# Altium footprint library 6-Connectors-5.PcbLib: 46 footprints (part 2 of 5) (continued)
## 3M_N3627-6202RB [mm] "3M, 3000 Series, 24 Contacts - Pitch 2.54mm - Straight Four-Wall Header (Black) With Short Roll Pin Latch/Ejectors" (continued)

## 3M_N3764-6002RB [mm] "3M, 3000 Series, 64 Contacts - Pitch 2.54mm - Straight Four-Wall Header (Black) Without Latch/Ejectors"
height 17.3
pads (66):
  round 1.6 hole 0.9: 1(-39.37,-1.27) 2(-39.37,1.27) 3(-36.83,-1.27) 4(-36.83,1.27) 5(-34.29,-1.27) 6(-34.29,1.27) 7(-31.75,-1.27) 8(-31.75,1.27) 9(-29.21,-1.27) 10(-29.21,1.27) 11(-26.67,-1.27) 12(-26.67,1.27) 13(-24.13,-1.27) 14(-24.13,1.27) 15(-21.59,-1.27) 16(-21.59,1.27) 17(-19.05,-1.27) 18(-19.05,1.27) 19(-16.51,-1.27) 20(-16.51,1.27) 21(-13.97,-1.27) 22(-13.97,1.27) 23(-11.43,-1.27) 24(-11.43,1.27) 25(-8.89,-1.27) 26(-8.89,1.27) 27(-6.35,-1.27) 28(-6.35,1.27) 29(-3.81,-1.27) 30(-3.81,1.27) 31(-1.27,-1.27) 32(-1.27,1.27) 33(1.27,-1.27) 34(1.27,1.27) 35(3.81,-1.27) 36(3.81,1.27) 37(6.35,-1.27) 38(6.35,1.27) 39(8.89,-1.27) 40(8.89,1.27) 41(11.43,-1.27) 42(11.43,1.27) 43(13.97,-1.27) 44(13.97,1.27) 45(16.51,-1.27) 46(16.51,1.27) 47(19.05,-1.27) 48(19.05,1.27) 49(21.59,-1.27) 50(21.59,1.27) 51(24.13,-1.27) 52(24.13,1.27) 53(26.67,-1.27) 54(26.67,1.27) 55(29.21,-1.27) 56(29.21,1.27) 57(31.75,-1.27) 58(31.75,1.27) 59(34.29,-1.27) 60(34.29,1.27) 61(36.83,-1.27) 62(36.83,1.27) 63(39.37,-1.27) 64(39.37,1.27)
  round 4.6 hole 2.6: MTG1(-48.31,-0.254) MTG2(48.31,-0.254)
Top Overlay:
  lines w0.2: -50.292,-2 -50.292,-4.318 50.292,-4.318 50.292,-2 ; -50.292,1.7 -50.292,4.3 50.292,4.3 50.292,1.7 ; -43.307,-3.175 43.307,-3.175 43.307,3.175 -43.307,3.175 -43.307,-3.175 ; -40.64,-3.175 -39.37,-4.318 -38.1,-3.175 -40.64,-3.175
  text "64" at 40.605,1.727 h1.02
  text "1" at -41.707,-2.921 h1.02
Mechanical 8:
  drawing of 276 lines, arcs and shapes, not listed
Mechanical 14:
  circle w0.1: c-48.324,-0.254 r1.27
  circle w0.1: c48.324,-0.254 r1.27
  lines w0.1: -50.292,-3.175 -46.964,-3.175 ; -49.324,-0.254 -48.324,-0.254 ; -48.324,-1.254 -48.324,-0.254 ; -48.324,0.746 -48.324,-0.254 ; -47.324,-0.254 -48.324,-0.254 ; -46.964,-4.318 -46.964,-1.727 ; -46.964,1.27 -46.964,4.318 ; -46.122,-4.318 -46.122,-1.727 ; -46.122,1.27 -46.122,4.318 ; -43.689,-4.318 -43.688,-1.727 ; -43.307,-1.727 -43.307,-3.175 ; -43.307,1.27 -43.307,3.175 ; -36.519,-4.318 -36.519,-3.175 ; -34.601,-4.318 -34.601,-3.175 ; -3.302,-4.318 -3.302,-3.175 ; 0.762,-4.318 0.762,-3.175 ; 37.141,-4.318 37.141,-3.175 ; 39.059,-4.318 39.059,-3.175 ; 42.846,-4.318 42.846,-3.175 ; 42.846,3.175 42.846,4.318 ; 43.307,-1.727 43.307,-3.175 ; 43.307,1.27 43.307,3.175 ; 43.688,1.27 43.688,4.318 ; 43.729,-4.318 43.729,-1.727 ; 46.122,-4.318 46.122,-1.727 ; 46.122,1.27 46.122,4.318 ; 46.964,-4.318 46.964,-1.727 40.005,-1.727 40.005,1.27 46.964,1.27 46.964,4.318 ; 46.964,-3.175 50.292,-3.175 ; 46.964,3.175 50.292,3.175 ; 47.324,-0.254 48.324,-0.254 ; 48.324,-1.254 48.324,-0.254 ; 48.324,0.746 48.324,-0.254 ; 49.324,-0.254 48.324,-0.254 ; -50.292,-4.318 -50.292,4.318 ; -50.292,-4.318 -50.292,4.318 ; -50.292,-4.318 -50.292,4.318 ; -50.292,-4.318 50.292,-4.318 ; -50.292,4.318 50.292,4.318 ; -43.307,-3.175 -43.307,3.175 ; -43.307,-3.175 -43.307,3.175 ; -43.307,-3.175 43.307,-3.175 ; -43.307,3.175 43.307,3.175 ; 43.307,-3.175 43.307,3.175 ; 43.307,-3.175 43.307,3.175 ; 50.292,-4.318 50.292,4.318 ; 50.292,-4.318 50.292,4.318 ; -50.292,3.175 -46.964,3.175 -50.292,3.175 ; -49.848,-1.134 -49.848,0.626 -48.324,1.506 -46.8,0.626 -46.8,-1.134 -48.324,-2.014 -49.848,-1.134 ; -43.688,1.27 -43.688,4.318 -43.688,1.27 ; -42.846,-4.318 -42.846,-3.175 -42.846,-4.318 ; -42.846,3.175 -42.846,4.318 -42.846,3.175 ; 46.8,-1.134 46.8,0.626 48.324,1.506 49.848,0.626 49.848,-1.134 48.324,-2.014 46.8,-1.134
  text "64" at 40.605,1.727 h1.02
  text "1" at -41.707,-2.921 h1.02
3D body "3M_N3764-6002RB.stp": height 17.27, standoff -3.94, extent -50.292,-4.318 50.292,4.318

## 3M_N3764-6202RB [mm] "3M, 3000 Series, 64 Contacts - Pitch 2.54mm - Straight Four-Wall Header (Black) With Short Roll Pin Latch/Ejectors"
height 24.6
pads (66):
  round 1.6 hole 0.9: 1(-39.37,-1.27) 2(-39.37,1.27) 3(-36.83,-1.27) 4(-36.83,1.27) 5(-34.29,-1.27) 6(-34.29,1.27) 7(-31.75,-1.27) 8(-31.75,1.27) 9(-29.21,-1.27) 10(-29.21,1.27) 11(-26.67,-1.27) 12(-26.67,1.27) 13(-24.13,-1.27) 14(-24.13,1.27) 15(-21.59,-1.27) 16(-21.59,1.27) 17(-19.05,-1.27) 18(-19.05,1.27) 19(-16.51,-1.27) 20(-16.51,1.27) 21(-13.97,-1.27) 22(-13.97,1.27) 23(-11.43,-1.27) 24(-11.43,1.27) 25(-8.89,-1.27) 26(-8.89,1.27) 27(-6.35,-1.27) 28(-6.35,1.27) 29(-3.81,-1.27) 30(-3.81,1.27) 31(-1.27,-1.27) 32(-1.27,1.27) 33(1.27,-1.27) 34(1.27,1.27) 35(3.81,-1.27) 36(3.81,1.27) 37(6.35,-1.27) 38(6.35,1.27) 39(8.89,-1.27) 40(8.89,1.27) 41(11.43,-1.27) 42(11.43,1.27) 43(13.97,-1.27) 44(13.97,1.27) 45(16.51,-1.27) 46(16.51,1.27) 47(19.05,-1.27) 48(19.05,1.27) 49(21.59,-1.27) 50(21.59,1.27) 51(24.13,-1.27) 52(24.13,1.27) 53(26.67,-1.27) 54(26.67,1.27) 55(29.21,-1.27) 56(29.21,1.27) 57(31.75,-1.27) 58(31.75,1.27) 59(34.29,-1.27) 60(34.29,1.27) 61(36.83,-1.27) 62(36.83,1.27) 63(39.37,-1.27) 64(39.37,1.27)
  round 4.6 hole 2.6: MTG1(-48.31,-0.254) MTG2(48.31,-0.254)
Top Overlay:
  lines w0.2: -50.292,-2 -50.292,-4.318 50.292,-4.318 50.292,-2 ; -50.292,1.7 -50.292,4.3 50.292,4.3 50.292,1.7 ; -43.307,-3.175 43.307,-3.175 43.307,3.175 -43.307,3.175 -43.307,-3.175 ; -40.64,-3.175 -39.37,-4.318 -38.1,-3.175 -40.64,-3.175
  text "64" at 40.605,1.727 h1.02
  text "1" at -41.707,-2.921 h1.02
Mechanical 8:
  drawing of 276 lines, arcs and shapes, not listed
Mechanical 14:
  circle w0.1: c-48.324,-0.254 r1.27
  circle w0.1: c48.324,-0.254 r1.27
  lines w0.1: -50.292,-3.175 -46.964,-3.175 ; -49.324,-0.254 -48.324,-0.254 ; -48.324,-1.254 -48.324,-0.254 ; -48.324,0.746 -48.324,-0.254 ; -47.324,-0.254 -48.324,-0.254 ; -46.964,-4.318 -46.964,-1.727 ; -46.964,1.27 -46.964,4.318 ; -46.122,-4.318 -46.122,-1.727 ; -46.122,1.27 -46.122,4.318 ; -43.689,-4.318 -43.688,-1.727 ; -43.307,-1.727 -43.307,-3.175 ; -43.307,1.27 -43.307,3.175 ; -36.519,-4.318 -36.519,-3.175 ; -34.601,-4.318 -34.601,-3.175 ; -3.302,-4.318 -3.302,-3.175 ; 0.762,-4.318 0.762,-3.175 ; 37.141,-4.318 37.141,-3.175 ; 39.059,-4.318 39.059,-3.175 ; 42.846,-4.318 42.846,-3.175 ; 42.846,3.175 42.846,4.318 ; 43.307,-1.727 43.307,-3.175 ; 43.307,1.27 43.307,3.175 ; 43.688,1.27 43.688,4.318 ; 43.729,-4.318 43.729,-1.727 ; 46.122,-4.318 46.122,-1.727 ; 46.122,1.27 46.122,4.318 ; 46.964,-4.318 46.964,-1.727 40.005,-1.727 40.005,1.27 46.964,1.27 46.964,4.318 ; 46.964,-3.175 50.292,-3.175 ; 46.964,3.175 50.292,3.175 ; 47.324,-0.254 48.324,-0.254 ; 48.324,-1.254 48.324,-0.254 ; 48.324,0.746 48.324,-0.254 ; 49.324,-0.254 48.324,-0.254 ; -50.292,-4.318 -50.292,4.318 ; -50.292,-4.318 -50.292,4.318 ; -50.292,-4.318 -50.292,4.318 ; -50.292,-4.318 50.292,-4.318 ; -50.292,4.318 50.292,4.318 ; -43.307,-3.175 -43.307,3.175 ; -43.307,-3.175 -43.307,3.175 ; -43.307,-3.175 43.307,-3.175 ; -43.307,3.175 43.307,3.175 ; 43.307,-3.175 43.307,3.175 ; 43.307,-3.175 43.307,3.175 ; 50.292,-4.318 50.292,4.318 ; 50.292,-4.318 50.292,4.318 ; -50.292,3.175 -46.964,3.175 -50.292,3.175 ; -49.848,-1.134 -49.848,0.626 -48.324,1.506 -46.8,0.626 -46.8,-1.134 -48.324,-2.014 -49.848,-1.134 ; -43.688,1.27 -43.688,4.318 -43.688,1.27 ; -42.846,-4.318 -42.846,-3.175 -42.846,-4.318 ; -42.846,3.175 -42.846,4.318 -42.846,3.175 ; 46.8,-1.134 46.8,0.626 48.324,1.506 49.848,0.626 49.848,-1.134 48.324,-2.014 46.8,-1.134
  text "64" at 40.605,1.727 h1.02
  text "1" at -41.707,-2.921 h1.02
3D body "3M_N3764-6202RB.stp": height 17.98, standoff -3.94, extent -59.689,-4.318 59.689,4.318

## 3M_N3793-6202RB [mm] "3M, 3000 Series, 10 Contacts - Pitch 2.54mm - Straight Four-Wall Header (Black) With Short Roll Pin Latch/Ejectors"
height 24.6
pads (12):
  round 1.6 hole 0.9: 1(-5.08,-1.27) 2(-5.08,1.27) 3(-2.54,-1.27) 4(-2.54,1.27) 5(0,-1.27) 6(0,1.27) 7(2.54,-1.27) 8(2.54,1.27) 9(5.08,-1.27) 10(5.08,1.27)
  round 4.6 hole 2.8: MTG1(-14.034,-0.256) MTG2(14.034,-0.252)
Top Overlay:
  lines w0.2: -15.998,-2.109 -15.998,-4.318 15.998,-4.318 15.998,-2.104 ; -15.998,1.596 -15.998,4.318 15.998,4.318 15.998,1.601 ; -6.35,-3.175 -5.08,-4.318 -3.81,-3.175 ; -2.03,-4.318 -2.03,-3.174 ; 2.032,-4.318 2.032,-3.174 ; 2.851,-4.318 2.851,-3.174 ; 4.767,-4.318 4.767,-3.174 ; -9.015,-3.174 9.015,-3.174 9.015,3.176 -9.015,3.176 -9.015,-3.174
  text "1" at -7.417,-2.921 h1.02
Mechanical 8:
  lines w0.1: -14.534,-0.256 -14.034,-0.256 ; -14.034,-0.756 -14.034,-0.256 ; -14.034,0.244 -14.034,-0.256 ; -13.534,-0.256 -14.034,-0.256 ; -5.58,-1.27 -5.08,-1.27 ; -5.58,1.27 -5.08,1.27 ; -5.08,-1.77 -5.08,-1.27 ; -5.08,-0.77 -5.08,-1.27 ; -5.08,0.77 -5.08,1.27 ; -5.08,1.77 -5.08,1.27 ; -4.58,-1.27 -5.08,-1.27 ; -4.58,1.27 -5.08,1.27 ; -3.04,-1.27 -2.54,-1.27 ; -3.04,1.27 -2.54,1.27 ; -2.54,-1.77 -2.54,-1.27 ; -2.54,-0.77 -2.54,-1.27 ; -2.54,0.77 -2.54,1.27 ; -2.54,1.77 -2.54,1.27 ; -2.04,-1.27 -2.54,-1.27 ; -2.04,1.27 -2.54,1.27 ; -0.5,-1.27 0,-1.27 ; -0.5,0 0,0 ; -0.5,1.27 0,1.27 ; 0,-1.77 0,-1.27 ; 0,-0.77 0,-1.27 ; 0,-0.5 0,0 ; 0,0.5 0,0 ; 0,0.77 0,1.27 ; 0,1.77 0,1.27 ; 0.5,-1.27 0,-1.27 ; 0.5,0 0,0 ; 0.5,1.27 0,1.27 ; 2.04,-1.27 2.54,-1.27 ; 2.04,1.27 2.54,1.27 ; 2.54,-1.77 2.54,-1.27 ; 2.54,-0.77 2.54,-1.27 ; 2.54,0.77 2.54,1.27 ; 2.54,1.77 2.54,1.27 ; 3.04,-1.27 2.54,-1.27 ; 3.04,1.27 2.54,1.27 ; 4.58,-1.27 5.08,-1.27 ; 4.58,1.27 5.08,1.27 ; 5.08,-1.77 5.08,-1.27 ; 5.08,-0.77 5.08,-1.27 ; 5.08,0.77 5.08,1.27 ; 5.08,1.77 5.08,1.27 ; 5.58,-1.27 5.08,-1.27 ; 5.58,1.27 5.08,1.27 ; 13.534,-0.252 14.034,-0.252 ; 14.034,-0.752 14.034,-0.252 ; 14.034,0.248 14.034,-0.252 ; 14.534,-0.252 14.034,-0.252
Mechanical 14:
  lines w0.1: -15.998,-4.318 15.998,-4.318 ; -15.998,-4.318 -15.998,4.318 ; -15.998,-4.318 15.998,-4.318 ; -15.998,-4.318 -15.998,4.318 ; -15.998,4.318 15.998,4.318 ; -15.998,4.318 15.998,4.318 ; -15.553,-1.133 -14.719,-1.615 -15.553,-1.133 ; -15.553,-1.133 -15.553,0.628 ; -15.553,-1.133 -15.553,0.628 ; -15.553,0.628 -14.719,1.109 -15.553,0.628 ; -14.719,-1.727 -11.985,-1.727 ; -14.719,-1.727 -14.719,1.271 ; -14.719,-1.727 -11.985,-1.727 ; -14.719,-1.727 -14.719,1.271 ; -14.719,1.271 -11.985,1.271 ; -14.719,1.271 -11.985,1.271 ; -14.031,-2.014 -13.535,-1.727 -14.031,-2.014 ; -14.031,-2.014 -14.526,-1.727 -14.031,-2.014 ; -14.031,1.507 -14.439,1.271 -14.031,1.507 ; -14.031,1.507 -13.622,1.271 -14.031,1.507 ; -11.985,-2.819 -8.759,-2.819 ; -11.985,-2.819 -11.985,-1.727 ; -11.985,-2.819 -8.759,-2.819 ; -11.985,-2.819 -11.985,-1.727 ; -11.985,1.271 -11.985,2.362 ; -11.985,1.271 -11.985,2.362 ; -11.985,2.362 -8.763,2.362 -11.985,2.362 ; -9.015,-3.174 -9.015,-2.819 -9.015,-3.174 ; -9.015,-3.174 9.015,-3.174 ; -9.015,-3.174 9.015,-3.174 ; -9.015,3.176 -9.015,2.362 -9.015,3.176 ; -9.015,3.176 9.015,3.176 ; -9.015,3.176 9.015,3.176 ; -8.759,-2.819 -8.759,-1.727 ; -8.759,-2.819 -8.759,-1.727 ; -8.759,-1.727 -5.713,-1.727 ; -8.759,-1.727 -5.713,-1.727 ; -8.759,1.271 -5.713,1.271 ; -8.759,1.271 -8.759,2.362 -8.759,1.271 ; -8.759,1.271 -5.713,1.271 ; -5.713,-1.727 -5.713,1.271 ; -5.713,-1.727 -5.713,1.271 ; 5.713,-1.727 8.759,-1.727 ; 5.713,-1.727 5.713,1.271 ; 5.713,-1.727 8.759,-1.727 ; 5.713,-1.727 5.713,1.271 ; 5.713,1.271 8.759,1.271 ; 5.713,1.271 8.759,1.271 ; 8.759,-2.819 11.985,-2.819 ; 8.759,-2.819 8.759,-1.727 ; 8.759,-2.819 11.985,-2.819 ; 8.759,-2.819 8.759,-1.727 ; 8.759,1.271 8.759,2.362 ; 8.759,1.271 8.759,2.362 ; 8.759,2.362 11.985,2.362 ; 8.759,2.362 11.985,2.362 ; 9.015,-3.174 9.015,-2.819 9.015,-3.174 ; 9.015,3.176 9.015,2.362 9.015,3.176 ; 11.985,-2.819 11.985,-1.727 ; 11.985,-2.819 11.985,-1.727 ; 11.985,-1.727 14.719,-1.727 ; 11.985,-1.727 14.719,-1.727 ; 11.985,1.271 14.719,1.271 ; 11.985,1.271 11.985,2.362 ; 11.985,1.271 14.719,1.271 ; 11.985,1.271 11.985,2.362 ; 14.031,-2.014 13.535,-1.727 14.031,-2.014 ; 14.031,-2.014 14.526,-1.727 14.031,-2.014 ; 14.031,1.507 14.439,1.271 14.031,1.507 ; 14.031,1.507 13.622,1.271 14.031,1.507 ; 14.719,-1.727 14.719,1.271 ; 14.719,-1.727 14.719,1.271 ; 15.553,-1.133 14.719,-1.615 15.553,-1.133 ; 15.553,-1.133 15.553,0.628 ; 15.553,-1.133 15.553,0.628 ; 15.553,0.628 14.719,1.109 15.553,0.628 ; 15.998,-4.318 15.998,4.318 ; 15.998,-4.318 15.998,4.318 ; -15.998,-3.174 -12.67,-3.174 -15.998,-3.174 ; -15.998,3.176 -12.67,3.176 -15.998,3.176 ; -12.67,-4.318 -12.67,-1.727 -12.67,-4.318 ; -12.67,1.271 -12.67,4.318 -12.67,1.271 ; -11.831,-4.318 -11.831,-2.819 -11.831,-4.318 ; -11.831,2.362 -11.831,4.318 -11.831,2.362 ; -9.395,-4.318 -9.395,-2.819 -9.395,-4.318 ; -9.395,2.362 -9.395,4.318 -9.395,2.362 ; -8.553,-4.318 -8.553,-3.174 -8.553,-4.318 ; -8.553,3.176 -8.553,4.318 -8.553,3.176 ; -2.03,-4.318 -2.03,-3.174 -2.03,-4.318 ; 2.032,-4.318 2.032,-3.174 2.032,-4.318 ; 2.851,-4.318 2.851,-3.174 2.851,-4.318 ; 4.767,-4.318 4.767,-3.174 4.767,-4.318 ; 8.553,-4.318 8.553,-3.174 8.553,-4.318 ; 8.553,3.176 8.553,4.318 8.553,3.176 ; 9.395,-4.318 9.395,-2.819 9.395,-4.318 ; 9.395,2.362 9.395,4.318 9.395,2.362 ; 11.831,-4.318 11.831,-2.819 11.831,-4.318 ; 11.831,2.362 11.831,4.318 11.831,2.362 ; 12.67,-4.318 12.67,-1.727 12.67,-4.318 ; 12.67,-3.174 15.998,-3.174 12.67,-3.174 ; 12.67,1.271 12.67,4.318 12.67,1.271 ; 12.67,3.176 15.998,3.176 12.67,3.176
3D body "3M_N3793-6202RB.stp": height 24.64, standoff -3.94, extent -16.002,-4.318 16.002,4.318

## 3M_N10220-5212PC [mm] "20 contacts, Mini D Ribbon (MDR), 102 Series, .050\" Boardmount Through-hole Right Angle Receptacle-Shielded"
height 9.4
pads (22):
  round 1.4 hole 0.8: 1(-5.715,-4.826) 2(-4.445,-2.921) 3(-3.175,-4.826) 4(-1.905,-2.921) 5(-0.635,-4.826) 6(0.635,-2.921) 7(1.905,-4.826) 8(3.175,-2.921) 9(4.445,-4.826) 10(5.715,-2.921) 11(-5.715,-1.016) 12(-4.445,0.889) 13(-3.175,-1.016) 14(-1.905,0.889) 15(-0.635,-1.016) 16(0.635,0.889) 17(1.905,-1.016) 18(3.175,0.889) 19(4.445,-1.016) 20(5.715,0.889)
  round 5.5 hole 2.8: 21(-13.716,-2.921) 22(13.716,-2.921)
Top Overlay:
  circle w0.3: c-5.715,-6.35 r0.15
  lines w0.2: -16.637,-4.578 -16.637,-5.715 -15.5,-5.715 ; -16.637,-1.5 -16.637,5.715 16.637,5.715 16.637,-1.5 ; -12,-5.715 12,-5.715 ; -10.414,5.715 -10.414,10.541 ; -10.414,9.271 -11.684,9.271 -11.684,9.906 -11.049,10.541 -10.414,10.541 ; -9.525,-5.715 -9.525,2.159 9.525,2.159 9.525,-5.715 ; -9.144,5.715 -9.144,10.541 -10.414,10.541 ; -8.212,5.715 -8.212,11.049 8.212,11.049 8.212,5.715 ; 9.144,5.715 9.144,10.541 10.414,10.541 ; 10.414,5.715 10.414,10.541 ; 10.414,9.271 11.684,9.271 11.684,9.906 11.049,10.541 10.414,10.541 ; 15.5,-5.715 16.637,-5.715 16.637,-4.578
  text "1" at -7.225,-5.31 h1.02
  text "2" at -6.605,-3.405 h1.02
  text "12" at -7.255,0.405 h1.02
  text "11" at -8.025,-1.5 h1.02
  text "19" at 5.705,-1.505 h1.02
  text "9" at 5.727,-5.293 h1.02
  text "10" at 6.8,-3.435 h1.02
  text "20" at 6.8,0.375 h1.02
Mechanical 8:
  lines w0.1: -14.216,-2.921 -13.716,-2.921 ; -13.716,-3.421 -13.716,-2.921 ; -13.716,-2.421 -13.716,-2.921 ; -13.216,-2.921 -13.716,-2.921 ; -6.215,-4.826 -5.715,-4.826 ; -6.215,-1.016 -5.715,-1.016 ; -5.715,-5.326 -5.715,-4.826 ; -5.715,-4.326 -5.715,-4.826 ; -5.215,-4.826 -5.715,-4.826 ; -5.215,-1.016 -5.715,-1.016 ; -4.945,-2.921 -4.445,-2.921 ; -4.945,0.889 -4.445,0.889 ; -4.445,-3.421 -4.445,-2.921 ; -4.445,-2.421 -4.445,-2.921 ; -4.445,0.389 -4.445,0.889 ; -4.445,1.389 -4.445,0.889 ; -3.945,-2.921 -4.445,-2.921 ; -3.945,0.889 -4.445,0.889 ; -3.675,-4.826 -3.175,-4.826 ; -3.675,-1.016 -3.175,-1.016 ; -3.175,-5.326 -3.175,-4.826 ; -3.175,-4.326 -3.175,-4.826 ; -2.675,-4.826 -3.175,-4.826 ; -2.675,-1.016 -3.175,-1.016 ; -2.405,-2.921 -1.905,-2.921 ; -2.405,0.889 -1.905,0.889 ; -1.905,-3.421 -1.905,-2.921 ; -1.905,-2.421 -1.905,-2.921 ; -1.905,0.389 -1.905,0.889 ; -1.905,1.389 -1.905,0.889 ; -1.405,-2.921 -1.905,-2.921 ; -1.405,0.889 -1.905,0.889 ; -1.135,-4.826 -0.635,-4.826 ; -1.135,-1.016 -0.635,-1.016 ; -0.635,-5.326 -0.635,-4.826 ; -0.635,-4.326 -0.635,-4.826 ; -0.5,0 0,0 ; -0.135,-4.826 -0.635,-4.826 ; -0.135,-1.016 -0.635,-1.016 ; 0.135,-2.921 0.635,-2.921 ; 0.135,0.889 0.635,0.889 ; 0.5,0 0,0 ; 0.635,-3.421 0.635,-2.921 ; 0.635,-2.421 0.635,-2.921 ; 0.635,0.389 0.635,0.889 ; 0.635,1.389 0.635,0.889 ; 1.135,-2.921 0.635,-2.921 ; 1.135,0.889 0.635,0.889 ; 1.405,-4.826 1.905,-4.826 ; 1.405,-1.016 1.905,-1.016 ; 1.905,-5.326 1.905,-4.826 ; 1.905,-4.326 1.905,-4.826 ; 2.405,-4.826 1.905,-4.826 ; 2.405,-1.016 1.905,-1.016 ; 2.675,-2.921 3.175,-2.921 ; 2.675,0.889 3.175,0.889 ; 3.175,-3.421 3.175,-2.921 ; 3.175,-2.421 3.175,-2.921 ; 3.175,0.389 3.175,0.889 ; 3.175,1.389 3.175,0.889 ; 3.675,-2.921 3.175,-2.921 ; 3.675,0.889 3.175,0.889 ; 3.945,-4.826 4.445,-4.826 ; 3.945,-1.016 4.445,-1.016 ; 4.445,-5.326 4.445,-4.826 ; 4.445,-4.326 4.445,-4.826 ; 4.945,-4.826 4.445,-4.826 ; 4.945,-1.016 4.445,-1.016 ; 5.215,-2.921 5.715,-2.921 ; 5.215,0.889 5.715,0.889 ; 5.715,-3.421 5.715,-2.921 ; 5.715,-2.421 5.715,-2.921 ; 5.715,0.389 5.715,0.889 ; 5.715,1.389 5.715,0.889 ; 6.215,-2.921 5.715,-2.921 ; 6.215,0.889 5.715,0.889 ; 13.216,-2.921 13.716,-2.921 ; 13.716,-3.421 13.716,-2.921 ; 13.716,-2.421 13.716,-2.921 ; 14.216,-2.921 13.716,-2.921 ; -5.715,-1.016 -5.715,-1.516 -5.715,-1.016 ; -5.715,-1.016 -5.715,-0.516 -5.715,-1.016 ; -3.175,-1.016 -3.175,-1.516 -3.175,-1.016 ; -3.175,-1.016 -3.175,-0.516 -3.175,-1.016 ; -0.635,-1.016 -0.635,-1.516 -0.635,-1.016 ; -0.635,-1.016 -0.635,-0.516 -0.635,-1.016 ; 0,0 0,-0.5 0,0 ; 0,0 0,0.5 0,0 ; 1.905,-1.016 1.905,-1.516 1.905,-1.016 ; 1.905,-1.016 1.905,-0.516 1.905,-1.016 ; 4.445,-1.016 4.445,-1.516 4.445,-1.016 ; 4.445,-1.016 4.445,-0.516 4.445,-1.016
Mechanical 14:
  circle w0.3: c-5.715,-6.35 r0.15
  circle w0.1: c13.716,-2.921 r1.245
  circle w0.1: c-13.716,-2.921 r1.245
  lines w0.1: -16.637,-5.715 -16.637,5.715 16.637,5.715 16.637,-5.715 ; -16.637,2.159 -10.795,2.159 -10.795,-5.715 ; -13.97,-4.139 -13.97,-5.099 -13.462,-5.099 -13.462,-4.139 ; -13.97,-1.703 -13.97,-0.743 -13.462,-0.743 -13.462,-1.703 ; -10.414,5.715 -10.414,10.541 ; -10.414,9.271 -11.684,9.271 -11.684,9.906 -11.049,10.541 -10.414,10.541 ; -9.525,-5.715 -9.525,2.159 9.525,2.159 9.525,-5.715 ; -9.144,5.715 -9.144,10.541 -10.414,10.541 ; -8.212,5.715 -8.212,11.049 8.212,11.049 8.212,5.715 ; 9.144,5.715 9.144,10.541 10.414,10.541 ; 10.414,5.715 10.414,10.541 ; 10.414,9.271 11.684,9.271 11.684,9.906 11.049,10.541 10.414,10.541 ; 10.795,-5.715 10.795,2.159 16.637,2.159 ; 13.462,-4.139 13.462,-5.099 13.97,-5.099 13.97,-4.139 ; 13.462,-1.703 13.462,-0.743 13.97,-0.743 13.97,-1.703
  text "1" at -7.225,-5.31 h1.02
  text "2" at -6.605,-3.405 h1.02
  text "12" at -7.255,0.405 h1.02
  text "11" at -8.025,-1.5 h1.02
  text "19" at 5.705,-1.505 h1.02
  text "9" at 5.727,-5.293 h1.02
  text "10" at 6.8,-3.435 h1.02
  text "20" at 6.8,0.375 h1.02
3D body "3M_N10220-5212PC.stp": height 9.4, standoff -3.81, extent -16.637,-5.715 16.637,11.049

## 3M_N10226-5212PC [mm] "26 contacts, Mini D Ribbon (MDR), 102 Series, .050\" Boardmount Through-hole Right Angle Receptacle-Shielded"
height 9.4
pads (28):
  round 1.4 hole 0.8: 1(-7.62,-4.826) 2(-6.35,-2.921) 3(-5.08,-4.826) 4(-3.81,-2.921) 5(-2.54,-4.826) 6(-1.27,-2.921) 7(0,-4.826) 8(1.27,-2.921) 9(2.54,-4.826) 10(3.81,-2.921) 11(5.08,-4.826) 12(6.35,-2.921) 13(7.62,-4.826) 14(-7.62,-1.016) 15(-6.35,0.889) 16(-5.08,-1.016) 17(-3.81,0.889) 18(-2.54,-1.016) 19(-1.27,0.889) 20(0,-1.016) 21(1.27,0.889) 22(2.54,-1.016) 23(3.81,0.889) 24(5.08,-1.016) 25(6.35,0.889) 26(7.62,-1.016)
  round 5.5 hole 2.8: 27(-15.621,-2.921) 28(15.621,-2.921)
Top Overlay:
  circle w0.3: c-7.62,-6.35 r0.15
  lines w0.2: -18.542,-4.578 -18.542,-5.715 -17.405,-5.715 ; -18.542,-1.5 -18.542,5.715 18.542,5.715 18.542,-1.5 ; -14,-5.715 14,-5.715 ; -12.319,5.715 -12.319,10.541 ; -12.319,9.271 -13.589,9.271 -13.589,9.906 -12.954,10.541 -12.319,10.541 ; -11.43,-5.715 -11.43,5.715 ; -11.43,2.159 11.43,2.159 ; -11.049,5.715 -11.049,10.541 -12.319,10.541 ; -10.1,5.715 -10.1,11.049 10.1,11.049 10.1,5.715 ; 11.049,5.715 11.049,10.541 12.319,10.541 ; 11.43,-5.715 11.43,5.715 ; 12.319,5.715 12.319,10.541 ; 12.319,9.271 13.589,9.271 13.589,9.906 12.954,10.541 12.319,10.541 ; 17.405,-5.715 18.542,-5.715 18.542,-4.578
  text "1" at -9.19,-5.31 h1.02
  text "2" at -8.32,-3.405 h1.02
  text "15" at -9.02,0.405 h1.02
  text "14" at -10.14,-1.5 h1.02
  text "26" at 8.77,-1.505 h1.02
  text "13" at 8.895,-5.315 h1.02
  text "12" at 7.615,-3.41 h1.02
  text "25" at 7.49,0.4 h1.02
Mechanical 8:
  lines w0.1: -8.12,-4.826 -7.62,-4.826 ; -8.12,-1.016 -7.62,-1.016 ; -7.62,-5.326 -7.62,-4.826 ; -7.62,-4.326 -7.62,-4.826 ; -7.12,-4.826 -7.62,-4.826 ; -7.12,-1.016 -7.62,-1.016 ; -6.85,-2.921 -6.35,-2.921 ; -6.85,0.889 -6.35,0.889 ; -6.35,-3.421 -6.35,-2.921 ; -6.35,-2.421 -6.35,-2.921 ; -6.35,0.389 -6.35,0.889 ; -6.35,1.389 -6.35,0.889 ; -5.85,-2.921 -6.35,-2.921 ; -5.85,0.889 -6.35,0.889 ; -5.58,-4.826 -5.08,-4.826 ; -5.58,-1.016 -5.08,-1.016 ; -5.08,-5.326 -5.08,-4.826 ; -5.08,-4.326 -5.08,-4.826 ; -4.58,-4.826 -5.08,-4.826 ; -4.58,-1.016 -5.08,-1.016 ; -4.31,-2.921 -3.81,-2.921 ; -4.31,0.889 -3.81,0.889 ; -3.81,-3.421 -3.81,-2.921 ; -3.81,-2.421 -3.81,-2.921 ; -3.81,0.389 -3.81,0.889 ; -3.81,1.389 -3.81,0.889 ; -3.31,-2.921 -3.81,-2.921 ; -3.31,0.889 -3.81,0.889 ; -3.04,-4.826 -2.54,-4.826 ; -3.04,-1.016 -2.54,-1.016 ; -2.54,-5.326 -2.54,-4.826 ; -2.54,-4.326 -2.54,-4.826 ; -2.04,-4.826 -2.54,-4.826 ; -2.04,-1.016 -2.54,-1.016 ; -1.77,-2.921 -1.27,-2.921 ; -1.77,0.889 -1.27,0.889 ; -1.27,-3.421 -1.27,-2.921 ; -1.27,-2.421 -1.27,-2.921 ; -1.27,0.389 -1.27,0.889 ; -1.27,1.389 -1.27,0.889 ; -0.77,-2.921 -1.27,-2.921 ; -0.77,0.889 -1.27,0.889 ; -0.5,-4.826 0,-4.826 ; -0.5,-1.016 0,-1.016 ; -0.5,0 0,0 ; 0,-5.326 0,-4.826 ; 0,-4.326 0,-4.826 ; 0.5,-4.826 0,-4.826 ; 0.5,-1.016 0,-1.016 ; 0.5,0 0,0 ; 0.77,-2.921 1.27,-2.921 ; 0.77,0.889 1.27,0.889 ; 1.27,-3.421 1.27,-2.921 ; 1.27,-2.421 1.27,-2.921 ; 1.27,0.389 1.27,0.889 ; 1.27,1.389 1.27,0.889 ; 1.77,-2.921 1.27,-2.921 ; 1.77,0.889 1.27,0.889 ; 2.04,-4.826 2.54,-4.826 ; 2.04,-1.016 2.54,-1.016 ; 2.54,-5.326 2.54,-4.826 ; 2.54,-4.326 2.54,-4.826 ; 3.04,-4.826 2.54,-4.826 ; 3.04,-1.016 2.54,-1.016 ; 3.31,-2.921 3.81,-2.921 ; 3.31,0.889 3.81,0.889 ; 3.81,-3.421 3.81,-2.921 ; 3.81,-2.421 3.81,-2.921 ; 3.81,0.389 3.81,0.889 ; 3.81,1.389 3.81,0.889 ; 4.31,-2.921 3.81,-2.921 ; 4.31,0.889 3.81,0.889 ; 4.58,-4.826 5.08,-4.826 ; 4.58,-1.016 5.08,-1.016 ; 5.08,-5.326 5.08,-4.826 ; 5.08,-4.326 5.08,-4.826 ; 5.58,-4.826 5.08,-4.826 ; 5.58,-1.016 5.08,-1.016 ; 5.85,-2.921 6.35,-2.921 ; 5.85,0.889 6.35,0.889 ; 6.35,-3.421 6.35,-2.921 ; 6.35,-2.421 6.35,-2.921 ; 6.35,0.389 6.35,0.889 ; 6.35,1.389 6.35,0.889 ; 6.85,-2.921 6.35,-2.921 ; 6.85,0.889 6.35,0.889 ; 7.12,-4.826 7.62,-4.826 ; 7.12,-1.016 7.62,-1.016 ; 7.62,-5.326 7.62,-4.826 ; 7.62,-4.326 7.62,-4.826 ; 8.12,-4.826 7.62,-4.826 ; 8.12,-1.016 7.62,-1.016 ; 15.121,-2.921 15.621,-2.921 ; 15.621,-3.421 15.621,-2.921 ; 15.621,-2.421 15.621,-2.921 ; 16.121,-2.921 15.621,-2.921 ; -7.62,-1.016 -7.62,-0.516 -7.62,-1.016 ; -7.62,-1.016 -7.62,-1.516 -7.62,-1.016 ; -5.08,-1.016 -5.08,-0.516 -5.08,-1.016 ; -5.08,-1.016 -5.08,-1.516 -5.08,-1.016 ; -2.54,-1.016 -2.54,-0.516 -2.54,-1.016 ; -2.54,-1.016 -2.54,-1.516 -2.54,-1.016 ; 0,-1.016 0,-0.516 0,-1.016 ; 0,-1.016 0,-1.516 0,-1.016 ; 0,0 0,0.5 0,0 ; 0,0 0,-0.5 0,0 ; 2.54,-1.016 2.54,-0.516 2.54,-1.016 ; 2.54,-1.016 2.54,-1.516 2.54,-1.016 ; 5.08,-1.016 5.08,-0.516 5.08,-1.016 ; 5.08,-1.016 5.08,-1.516 5.08,-1.016 ; 7.62,-1.016 7.62,-0.516 7.62,-1.016 ; 7.62,-1.016 7.62,-1.516 7.62,-1.016
  lines w0.2: -16.121,-2.921 -15.621,-2.921 ; -15.621,-3.421 -15.621,-2.921 ; -15.621,-2.421 -15.621,-2.921 ; -15.121,-2.921 -15.621,-2.921
Mechanical 14:
  circle w0.3: c-7.62,-6.35 r0.15
  circle w0.1: c15.621,-2.921 r1.245
  circle w0.1: c15.621,-2.921 r1.245
  circle w0.1: c-15.621,-2.921 r1.245
  lines w0.1: -18.542,2.159 -12.7,2.159 -12.7,-5.715 ; -15.875,-4.139 -15.875,-5.099 -15.367,-5.099 -15.367,-4.139 ; -15.875,-1.703 -15.875,-0.743 -15.367,-0.743 -15.367,-1.703 ; -12.319,5.715 -12.319,10.541 ; -12.319,9.271 -13.589,9.271 -13.589,9.906 -12.954,10.541 -12.319,10.541 ; -11.43,-5.715 -11.43,5.715 ; -11.43,2.159 11.43,2.159 ; -11.049,5.715 -11.049,10.541 -12.319,10.541 ; -10.1,5.715 -10.1,11.049 10.1,11.049 10.1,5.715 ; 11.049,5.715 11.049,10.541 12.319,10.541 ; 11.43,-5.715 11.43,5.715 ; 12.319,5.715 12.319,10.541 ; 12.319,9.271 13.589,9.271 13.589,9.906 12.954,10.541 12.319,10.541 ; 12.7,-5.715 12.7,2.159 18.542,2.159 ; 15.367,-4.139 15.367,-5.099 15.875,-5.099 15.875,-4.139 ; 15.367,-1.703 15.367,-0.743 15.875,-0.743 15.875,-1.703 ; -18.542,-5.715 -18.542,5.715 18.542,5.715 18.542,-5.715 -18.542,-5.715
  text "1" at -9.19,-5.31 h1.02
  text "2" at -8.32,-3.405 h1.02
  text "15" at -9.02,0.405 h1.02
  text "14" at -10.14,-1.5 h1.02
  text "26" at 8.77,-1.505 h1.02
  text "13" at 8.895,-5.315 h1.02
  text "12" at 7.615,-3.41 h1.02
  text "25" at 7.49,0.4 h1.02
3D body "3M_N10226-5212PC.stp": height 9.4, standoff -3.81, extent -18.542,-5.715 18.542,11.049